# Altium footprint library MCx.PcbLib: 53 footprints (part 2 of 4)
Each footprint in its own frame and in the unit in brackets; x right, y up, seen from the top. Pads: shape width x height; smd on the part's side, far side on the other; paste and mask are expansions set on the pad; w line width, h text height; cw(c..) or ccw(c..) is an arc to the next point about the centre after c.
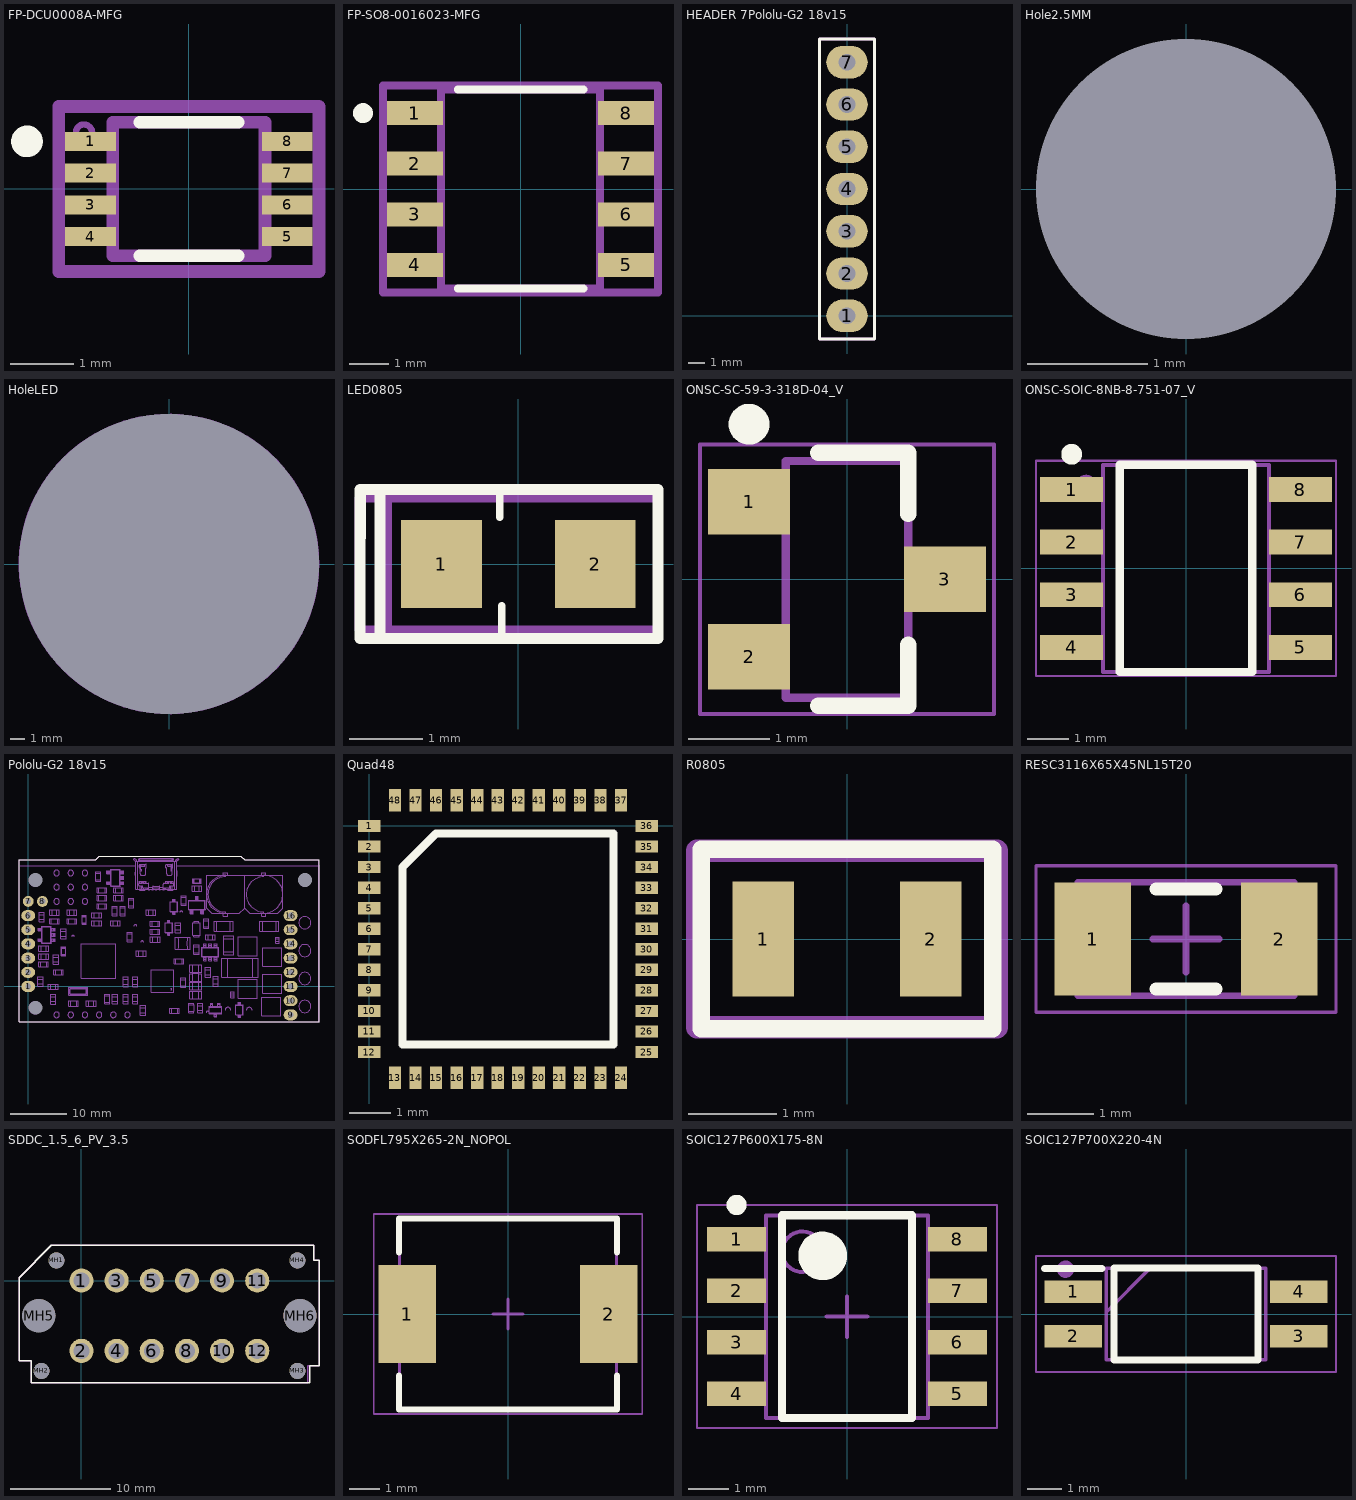
[diagram p1: the footprints below, top view; thin cyan lines are the x and y axes]

## FP-DCU0008A-MFG [mm]
pads (8):
  rect 0.8x0.3 smd paste-1000 mask+0: 1(-1.55,0.75) 2(-1.55,0.25) 3(-1.55,-0.25) 4(-1.55,-0.75) 5(1.55,-0.75) 6(1.55,-0.25) 7(1.55,0.25) 8(1.55,0.75)
Top Overlay:
  circle w0.25: c-2.55,0.75 r0.125
  lines w0.2: -0.775,-1.05 0.775,-1.05 ; -0.775,1.05 0.775,1.05
Top Paste:
  rectangle: 1.175,-0.875 1.925,-0.625
  rectangle: 1.175,-0.375 1.925,-0.125
  rectangle: 1.175,0.125 1.925,0.375
  rectangle: 1.175,0.625 1.925,0.875
  rectangle: -1.925,-0.875 -1.175,-0.625
  rectangle: -1.925,-0.375 -1.175,-0.125
  rectangle: -1.925,0.125 -1.175,0.375
  rectangle: -1.925,0.625 -1.175,0.875
Top Courtyard:
  lines w0.2: -2.05,-1.3 2.05,-1.3 2.05,1.3 -2.05,1.3 -2.05,-1.3
Mechanical 13:
  lines w0.2: -1.2,-1.05 1.2,-1.05 1.2,1.05 -1.2,1.05 -1.2,-1.05
Top Assembly (Mech29):
  circle w0.1: c-1.651,0.889 r0.127
  lines w0.2: -2.05,-1.3 2.05,-1.3 2.05,1.3 -2.05,1.3 -2.05,-1.3
  text ".Designator" at -2.252,-0.226 h1
3D body "IC_Texas_Instruments_TXB0102DCUR_eec.STEP": height 0.25, standoff 0, extent -2.05,-1.3 2.05,1.3

## FP-SO8-0016023-MFG [mm]
pads (8):
  rect 1.4x0.6 smd paste+0 mask+0: 1(-2.65,1.905) 2(-2.65,0.635) 3(-2.65,-0.635) 4(-2.65,-1.905) 5(2.65,-1.905) 6(2.65,-0.635) 7(2.65,0.635) 8(2.65,1.905)
Top Overlay:
  circle w0.25: c-3.953,1.905 r0.125
  lines w0.2: -1.575,-2.5 1.575,-2.5 ; -1.575,2.5 1.575,2.5
Top Courtyard:
  lines w0.2: -3.45,-2.6 -3.45,2.6 3.45,2.6 3.45,-2.6 -3.45,-2.6
Mechanical 13:
  lines w0.2: -2,-2.5 -2,2.5 2,2.5 2,-2.5 -2,-2.5
Top Assembly (Mech29):
  lines w0.2: -3.45,-2.6 -3.45,2.6 3.45,2.6 3.45,-2.6 -3.45,-2.6
  text ".Designator" at -2.252,-0.226 h1
3D body "IC_STMicroelectronics_E-L9637D013TR_eec.STEP": height 0.25, standoff 0, extent -3.45,-2.6 3.45,2.6

## HEADER 7Pololu-G2 18v15 [mm] "HEADER 7 FOR Pololu Motor Controller  G2 18V15"
pads (7):
  oval 2.5x1.95 hole 1.02: 1(0,0) 2(0,2.54) 3(0,5.08) 4(0,7.62) 5(0,10.16) 6(0,12.7) 7(0,15.24)
Top Overlay:
  lines w0.203: -1.651,-1.397 1.651,-1.397 1.651,16.637 -1.651,16.637 -1.651,-1.397
Top Courtyard:
  lines w0.203: -1.651,-1.397 1.651,-1.397 1.651,16.637 -1.651,16.637 -1.651,-1.397
Top Assembly (Mech29):
  lines w0.203: -1.651,-1.397 1.651,-1.397 1.651,16.637 -1.651,16.637 -1.651,-1.397
  text "'.Designator'" at 0.833,-4.091 h2
3D body "901471107.stp": height 8.51, standoff -2.89, extent -1.27,-1.27 1.27,16.51

## Hole2.5MM [mm] "Hole For M2 or #2-56"
pads (1):
  round 2 hole 2.5: ""(0,0)

## HoleLED [mm] "Hole For Panel LED"
pads (1):
  round 2 hole 21.209: ""(0,0)
Top Courtyard:
  circle w0.254: c0,0 r10.5

## LED0805 [mm]
pads (2):
  rect 1.1x1.2 smd: 1(-1.05,0) 2(1.05,0)
Top Overlay:
  lines w0.102: -0.254,0.635 -0.254,1.016 ; -0.226,-0.952 -0.226,-0.572
  lines w0.152: -1.889,-1.016 -1.889,1.014 ; -2.161,-1.016 -2.161,0.363 -2.159,0.365 -2.159,1.016 1.905,1.016 1.905,-1.016 -2.161,-1.016
Top Assembly (Mech29):
  lines w0.102: -1.778,-0.889 -1.778,0.889 ; -2.189,-0.889 -2.189,0.889 1.905,0.889 1.905,-0.889 -2.189,-0.889
  text "'.Designator'" at -3.597,-0.264 h0.64
3D body "WL-SMCW_0805_LED.stp": height 0.68, standoff -0.02, extent -1,-0.625 1,0.625

## ONSC-SC-59-3-318D-04_V [mm] "SOT23, 3-Leads, Body 2.9x1.5mm, Pitch 0.95mm"
height 1.3
pads (3):
  rect 1x0.8 smd: 1(-1.2,0.95) 2(-1.2,-0.95) 3(1.2,0)
Top Overlay:
  circle w0.25: c-1.2,1.9 r0.125
  lines w0.2: -0.354,-1.55 0.75,-1.55 0.75,-0.8 ; -0.354,1.55 0.75,1.55 0.75,0.8
Mechanical 13:
  lines w0.1: -0.75,-1.45 -0.75,1.45 0.75,1.45 0.75,-1.45 -0.75,-1.45
Top Assembly (Mech29):
  circle w0.102: c-1.27,1.016 r0.18
  lines w0.05: -1.8,-1.65 -1.8,1.65 1.8,1.65 1.8,-1.65 -1.8,-1.65
  text "'.Designator'" at -4.317,-0.317 h0.76
3D body: height 1.3, standoff 0.01, extent -0.75,-1.45 0.75,1.45

## ONSC-SOIC-8NB-8-751-07_V [mm] "SOIC, 8-Leads, Body 5x4mm, Pitch 1.27mm"
height 1.75
pads (8):
  rect 1.52x0.6 smd: 1(-2.76,1.905) 2(-2.76,0.635) 3(-2.76,-0.635) 4(-2.76,-1.905) 5(2.76,-1.905) 6(2.76,-0.635) 7(2.76,0.635) 8(2.76,1.905)
Top Overlay:
  circle w0.25: c-2.76,2.755 r0.125
  lines w0.2: -1.6,-2.5 -1.6,2.5 1.6,2.5 1.6,-2.5 -1.6,-2.5
Mechanical 13:
  lines w0.1: -2,-2.5 2,-2.5 2,2.5 -2,2.5 -2,-2.5
Top Assembly (Mech29):
  circle w0.102: c-2.413,2.032 r0.18
  lines w0.05: -3.62,-2.6 3.62,-2.6 3.62,2.6 -3.62,2.6 -3.62,-2.6
  text "'.Designator'" at -4.317,-0.317 h0.76
3D body: height 1.75, standoff 0.1, extent -2,-2.5 2,2.5

## Pololu-G2 18v15 [mm] "Pololu Motor Controller  G2 18V15"
pads (19):
  oval 2.5x1.95 hole 1.02: 1(0,0) 2(0,2.54) 3(0,5.08) 4(0,7.62) 5(0,10.16) 6(0,12.7) 9(46.99,-5.08) 10(46.99,-2.54) 11(46.99,0) 12(46.99,2.54) 13(46.99,5.08) 14(46.99,7.62) 15(46.99,10.16) 16(46.99,12.7)
  round 1.95 hole 1.02: 7(0,15.24) 8(2.54,15.24)
  round 0 hole 2.5 unplated: ""(1.27,-3.81) ""(1.27,19.05) ""(49.53,19.05)
Top Overlay:
  lines w0.102: -1.651,-6.35 52.07,-6.35 ; -1.651,-6.35 -1.651,22.727 12.06,22.727 12.695,23.362 38.098,23.362 38.733,22.727 52.07,22.727 52.07,-6.35 ; -1.651,-6.35 52.07,-6.35
Mechanical 1:
  drawing of 3313 lines, arcs and shapes, not listed
Top Assembly (Mech29):
  lines w0.102: -1.651,-6.35 -1.648,-6.353 52.067,-6.353 52.067,22.723 38.73,22.723 38.095,23.358 12.692,23.358 12.057,22.723 -1.651,22.723 -1.651,-6.35
  text "'.Designator'" at 16.81,8.08 h2

## Quad48 [mm]
pads (48):
  rect 0.55x0.3 smd: 1(0,0) 2(0,-0.5) 3(0,-1) 4(0,-1.5) 5(0,-2) 6(0,-2.5) 7(0,-3) 8(0,-3.5) 9(0,-4) 10(0,-4.5) 11(0,-5) 12(0,-5.5) 25(6.75,-5.5) 26(6.75,-5) 27(6.75,-4.5) 28(6.75,-4) 29(6.75,-3.5) 30(6.75,-3) 31(6.75,-2.5) 32(6.75,-2) 33(6.75,-1.5) 34(6.75,-1) 35(6.75,-0.5) 36(6.75,0)
  rect 0.3x0.55 smd: 13(0.625,-6.125) 14(1.125,-6.125) 15(1.625,-6.125) 16(2.125,-6.125) 17(2.625,-6.125) 18(3.125,-6.125) 19(3.625,-6.125) 20(4.125,-6.125) 21(4.625,-6.125) 22(5.125,-6.125) 23(5.625,-6.125) 24(6.125,-6.125) 37(6.125,0.625) 38(5.625,0.625) 39(5.125,0.625) 40(4.625,0.625) 41(4.125,0.625) 42(3.625,0.625) 43(3.125,0.625) 44(2.625,0.625) 45(2.125,0.625) 46(1.625,0.625) 47(1.125,0.625) 48(0.625,0.625)
Top Overlay:
  lines w0.2: 0.81,-5.315 5.94,-5.315 5.94,-0.185 1.62,-0.185 0.81,-0.995 0.81,-5.315

## R0805 [mm]
pads (2):
  rect 0.7x1.3 smd: 1(-0.95,0) 2(0.95,0)
Top Overlay:
  lines w0.2: -1.651,-1.016 -1.651,1.016 1.651,1.016 1.651,-1.016 -1.651,-1.016
Top Assembly (Mech29):
  lines w0.254: -1.7,-1 -1.7,1 1.7,1 1.7,-1 -1.7,-1
  text ".Designator" at -3.174,-0.212 h0.64
3D body "R0805.step": height 0.7, standoff 0, extent -1,-0.6 1,0.6

## RESC3116X65X45NL15T20 [mm] "Chip Resistor, 2-Leads, Body 3.25x1.7mm, IPC Medium Density"
height 0.65
pads (2):
  rect 1.15x1.7 smd: 1(-1.4,0) 2(1.4,0)
Top Overlay:
  lines w0.2: -0.45,-0.75 0.45,-0.75 ; -0.45,0.75 0.45,0.75
Mechanical 13:
  lines w0.1: -1.625,-0.85 -1.625,0.85 1.625,0.85 1.625,-0.85 -1.625,-0.85
Mechanical 15:
  lines w0.05: -2.25,-1.1 -2.25,1.1 2.25,1.1 2.25,-1.1 -2.25,-1.1
  lines w0.1: -0.5,0 0.5,0 ; 0,-0.5 0,0.5
Top Assembly (Mech29):
  lines w0.05: -2.25,-1.1 -2.25,1.1 2.25,1.1 2.25,-1.1 -2.25,-1.1
  text "'.Designator'" at -3.965,-0.292 h0.7
3D body "RESC3116X06N.step": height 0.65, standoff 0, extent -1.625,-0.85 1.625,0.85

## SDDC_1.5_6_PV_3.5 [mm]
pads (18):
  round 2.4 hole 1.6: 1(0,0) 2(0,-7) 3(3.5,0) 4(3.5,-7) 5(7,0) 6(7,-7) 7(10.5,0) 8(10.5,-7) 9(14,0) 10(14,-7) 11(17.5,0) 12(17.5,-7)
  round 1.6 hole 1.6 unplated: MH1(-2.5,2) MH2(-4,-9) MH3(21.5,-9) MH4(21.5,2)
  round 3.3 hole 3.3 unplated: MH5(-4.25,-3.5) MH6(21.75,-3.5)
Top Overlay:
  lines w0.127: -6.223,-8 -6.223,0.277 -3,3.5 23.15,3.5 23.15,2 23.65,2 23.65,-8.5 22.733,-8.5 22.733,-10.16 -5,-10.16 -5,-8 -6.223,-8
Top Courtyard:
  lines w0.127: -6.223,-8 -6.223,0.277 -3,3.5 23.15,3.5 23.15,2 23.65,2 23.65,-8.5 22.515,-8.5 22.515,-10.16 -5,-10.16 -5,-8 -6.223,-8
3D body "pxc_1848684_01_SDDC-1-5-6-PV-3-5_3D.stp": height 14.1, standoff -3.5, extent -5.9,-10.25 23.4,3.25

## SODFL795X265-2N_NOPOL [mm] "SODFL, 2-Leads, Body 5.90x7.95mm, IPC Medium Density"
height 2.65
pads (2):
  rect 1.9x3.25 smd: 1(-3.325,0) 2(3.325,0)
Top Overlay:
  lines w0.2: -3.6,-2.025 -3.6,-3.15 3.6,-3.15 3.6,-2.025 ; -3.6,2.025 -3.6,3.15 3.6,3.15 3.6,2.025
Top Courtyard:
  lines w0.05: -4.425,-3.3 -4.425,3.3 4.425,3.3 4.425,-3.3 -4.425,-3.3
  lines w0.1: -0.5,0 0.5,0 ; 0,-0.5 0,0.5
Top Assembly (Mech29):
  lines w0.1: -3.575,-3.125 -3.575,-2.909 -3.575,3.125 3.575,3.125 3.575,-3.125 -2.712,-3.125 -3.575,-3.125
  text "'.Designator'" at -2.878,-0.212 h0.51
3D body "SODFL795X265-2N.step": height 2.65, standoff 0, extent -3.975,-3.125 3.975,3.125

## SOIC127P600X175-8N [mm] "SOIC, 8-Leads, Body 4.90x3.90mm, Pitch 1.27mm, IPC Medium Density"
height 1.75
pads (8):
  rect 1.45x0.6 smd: 1(-2.725,1.905) 2(-2.725,0.635) 3(-2.725,-0.635) 4(-2.725,-1.905) 5(2.725,-1.905) 6(2.725,-0.635) 7(2.725,0.635) 8(2.725,1.905)
Top Overlay:
  circle w0.6: c-0.6,1.5 r0.3
  circle w0.25: c-2.725,2.755 r0.125
  lines w0.2: -1.6,-2.5 1.6,-2.5 1.6,2.5 -1.6,2.5 -1.6,-2.5
Top Courtyard:
  lines w0.05: -3.7,-2.75 3.7,-2.75 3.7,2.75 -3.7,2.75 -3.7,-2.75
  lines w0.1: -0.5,0 0.5,0 ; 0,-0.5 0,0.5
Top Assembly (Mech29):
  circle w0.1: c-1.1,1.6 r0.5
  lines w0.1: -2,-2.5 2,-2.5 2,2.5 -2,2.5 -2,-2.5
  text "'.Designator'" at -2.878,-0.212 h0.51
3D body "SOIC127P600X175-8N.step": height 1.75, standoff 0, extent -3,-2.5 3,2.5

## SOIC127P700X220-4N [mm]
pads (4):
  rect 1.65x0.65 smd: 1(-3.25,0.635) 2(-3.25,-0.635) 3(3.25,-0.635) 4(3.25,0.635)
Top Overlay:
  lines w0.2: -4.075,1.31 -2.425,1.31 ; -2.075,-1.325 -2.075,1.325 2.075,1.325 2.075,-1.325 -2.075,-1.325
Mechanical 13:
  lines w0.1: -2.3,0.055 -1.03,1.325 ; -2.3,-1.325 -2.3,1.325 2.3,1.325 2.3,-1.325 -2.3,-1.325
Mechanical 15:
  lines w0.05: -4.325,-1.675 -4.325,1.675 4.325,1.675 4.325,-1.675 -4.325,-1.675
Top Assembly (Mech29):
  circle w0.254: c-3.473,1.291 r0.121
  lines w0.05: -4.325,-1.675 -4.325,1.675 4.325,1.675 4.325,-1.675 -4.325,-1.675
  text "'.Designator'" at -3.965,-0.292 h0.7
3D body "TLP292(GB-TPL,E.stp": height 2.2, standoff 0, extent -3.5,-1.325 3.5,1.325